# Altium schematic symbol library Analog Devices Data Converters Analog-to-Digital Converters.SchLib: 2404 symbols (part 110 of 213)
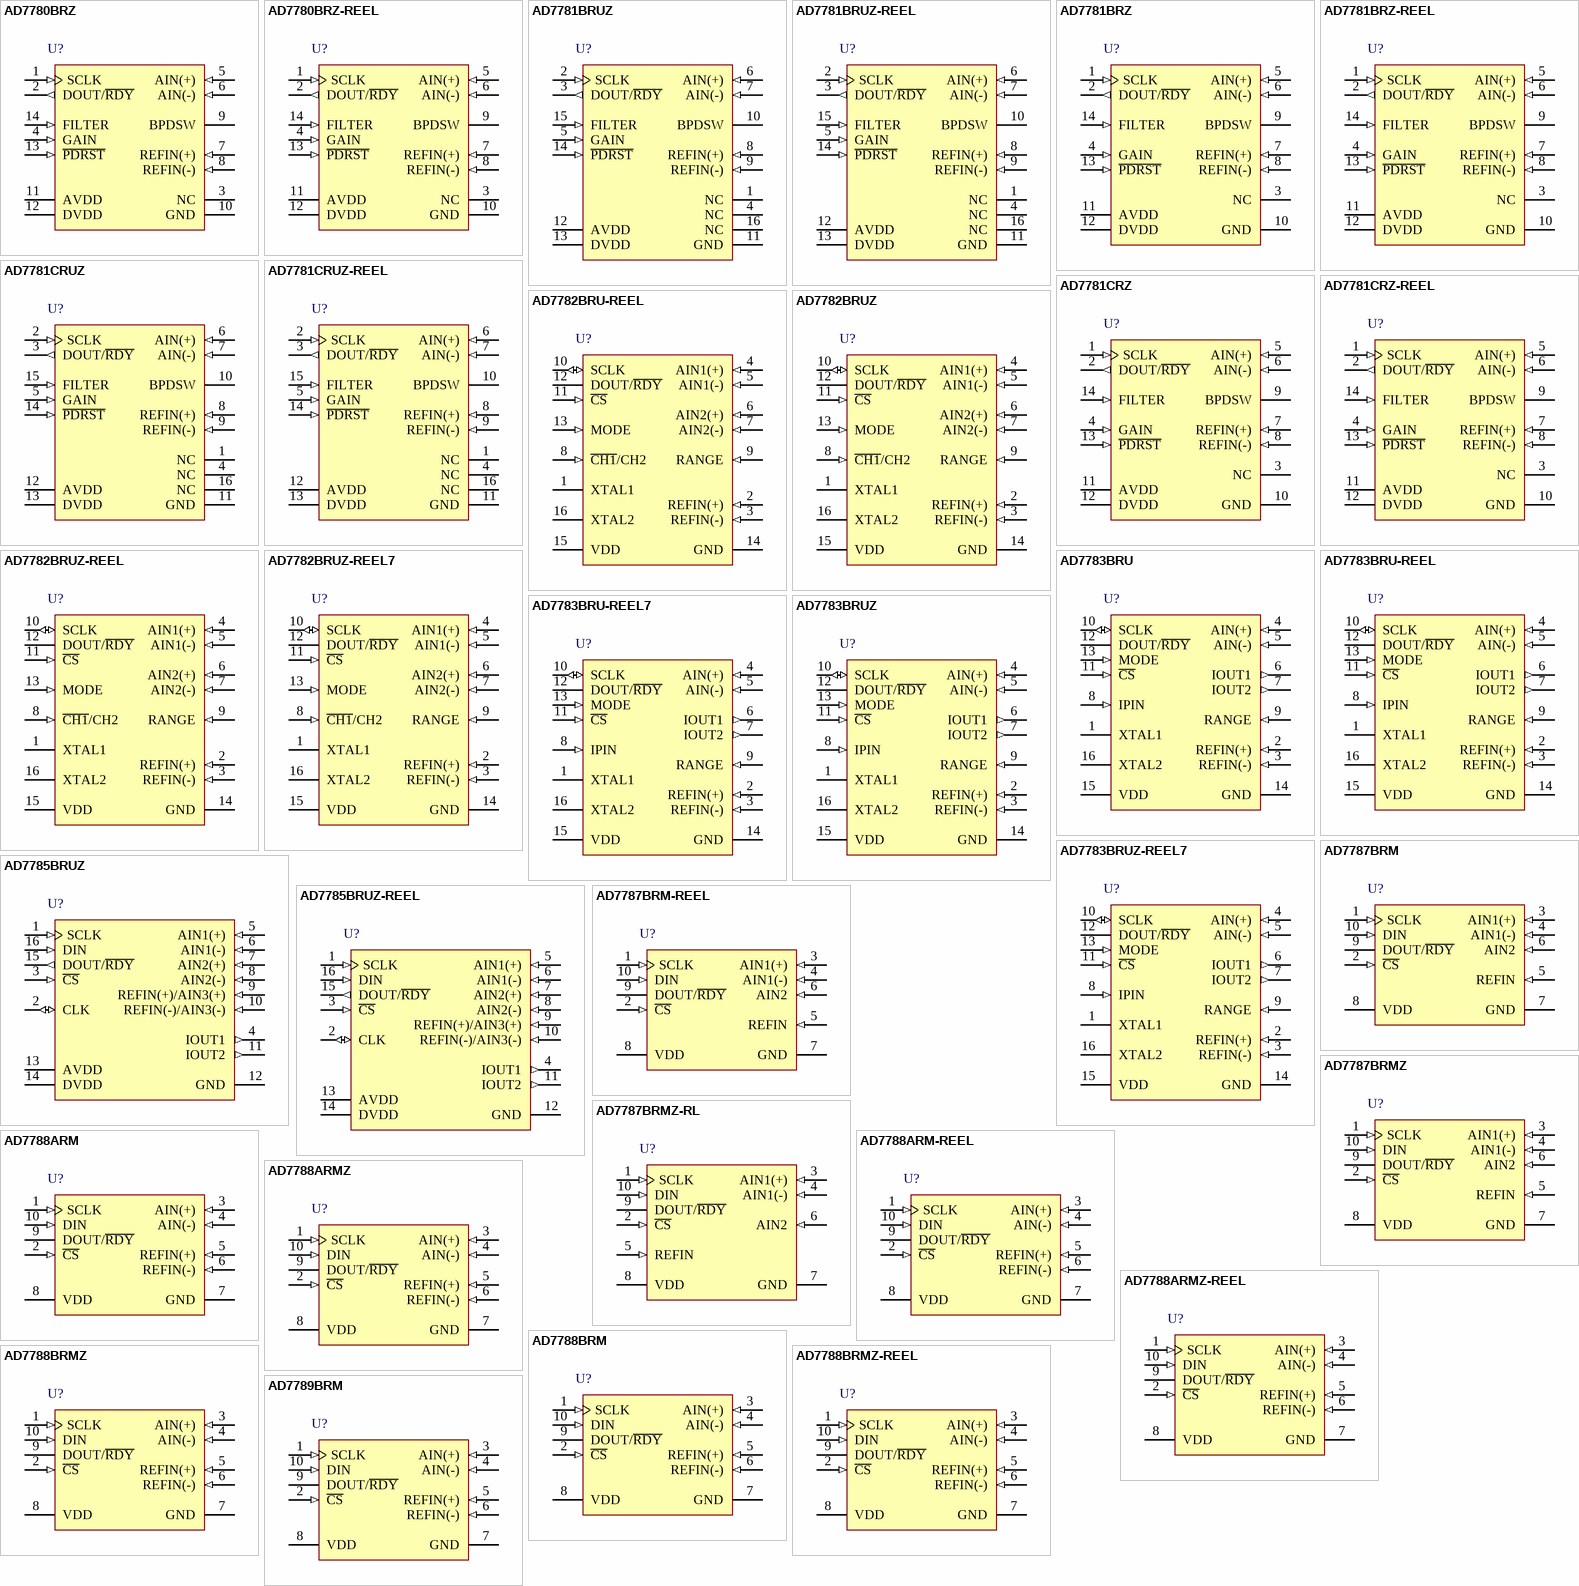
[diagram p265: symbols AD7780BRZ to AD7789BRM]

## AD7782BRU-REEL
designator U?
Dual 24-Bit Sigma-Delta Analog-to-Digital Converter with Serial, SPI Interface, 19.79SPS, -40 to +85 degC, RU-16, Reel; Generic Part Number: AD7782; Manufacturer: Analog Devices; PartNumber: AD7782BRU-REEL; Resolution (Bits): 24; Channels: 2; Throughput Rate (SPS): 19.79; Interface: Ser, SPI; DatasheetVersion: Rev.A; PackageVersion: Nov-2002; PackageReference: RU-16; PackageDescription: 16-Lead Thin Shrink Small Outline Package [TSSOP]; Supplier 1: Digi-Key; Supplier Part Number 1: AD7782BRU-REELTR-ND; Supplier 2: Digi-Key; Supplier Part Number 2: AD7782BRU-REELCT-ND; Supplier 3: Digi-Key; Supplier Part Number 3: AD7782BRU-REELDKR-ND; Supplier 4: Mouser; Supplier Part Number 4: 584-AD7782BRU-R; RoHS: N; Packing: Reel; Mounting Technology: Surface Mount; Code_JEDEC: MO-153-AB; ComponentLink1Description: Manufacturer URL; ComponentLink1URL: http://www.analog.com/en/index.html; ComponentLink2Description: Datasheet; ComponentLink2URL: http://www.analog.com/static/imported-files/data_sheets/AD7782.pdf; ComponentLink3Description: Package Specification; ComponentLink3URL: http://www.analog.com/static/imported-files/packages/36244347913743854010197452789RU16.pdf; ComponentLink4Description: Product URL; ComponentLink4URL: http://www.analog.com/en/analog-to-digital-converters/ad-converters/ad7782/products/product.html
footprint RU-16_N (TSOP, 16-Leads, Body 5x4.4mm, Pitch 0.65mm, IPC Medium Density)
footprint RU-16_L (TSOP, 16-Leads, Body 5x4.4mm, Pitch 0.65mm, IPC High Density)
footprint RU-16_M (TSOP, 16-Leads, Body 5x4.4mm, Pitch 0.65mm, IPC Low Density)
pins: 1 XTAL1 "Input to the 32.768 kHz Crystal Oscillator Inverter.", 2 REFIN(+) (in) "Positive Reference Input. REFIN(+) can lie anywhere between VDD and GND +1 V. The nominal reference voltage (REFIN(+) - REFIN(-)) is 2.5 V, but the part functions with a reference from 1 V to VDD.", 3 REFIN(-) (in) "Negative Reference Input. This reference input can lie anywhere between GND and VDD - 1 V.", 4 AIN1(+) (in) "Analog Input. AIN1(+) is the positive terminal of the fully-differential analog input pair AIN1(+)/AIN1(-).", 5 AIN1(-) (in) "Analog Input. AIN1(-) is the negative terminal of the fully-differential analog input pair AIN1(+)/AIN1(-).", 6 AIN2(+) (in) "Analog Input. AIN2(+) is the positive terminal of the fully-differential analog input pair AIN2(+)/AIN2(-).", 7 AIN2(-) (in) "Analog Input. AIN2(-) is the negative terminal of the fully-differential analog input pair AIN2(+)/AIN2(-).", 8 ~{CH1}/CH2 (in) "Channel Select, Logic Input. With C\H\1\/CH2 = 0, channel AIN1(+)/AIN1(-) is selected while the active channel is AIN2(+)/AIN2(-) when C\H\1\/CH2 = 1.", 9 RANGE (in) "Logic Input which configures the input range on the internal PGA. With RANGE = 0, the full-scale input range is +/-160 mV while the full-scale input range equals +/-2.56 V when RANGE = 1 for a +2.5 V Reference.", 10 SCLK (io) "Serial Clock Input/Output for Data Transfers from the ADC. When the device is operated in master mode SCLK is an output with one SCLK period equal to one XTAL period. In slave mode, SCLK is generated by an external source. (See Datasheet)", 11 ~{CS} (in) "Chip Select Input. C\S\ is an active low logic input used to select the AD7782. When C\S\ is low, the PLL establishes lock and allows the AD7782 to initiate a conversion on the selected channel. When C\S\ is high,the (See Datasheet)", 12 DOUT/~{RDY} (hiz) "Serial Data Output/Data Ready Output. DOUT/R\D\Y\ serves a dual purpose in this interface. When a conversion is initiated, DOUT/R\D\Y\ goes high and remains high until the conversion is complete. DOUT/R\D\Y\ will then return (See Datasheet)", 13 MODE (in) "The MODE pin selects master or slave mode of operation. When MODE = 0, the AD7782 operates in master mode while the AD7782 is configured for slave mode when MODE = 1.", 14 GND (power) "Ground Reference Point for the AD7782.", 15 VDD (power) "Supply Voltage, 3 V or 5 V Nominal.", 16 XTAL2 "Output from the 32.768 kHz Crystal Oscillator Inverter."

## AD7782BRUZ
designator U?
Dual 24-Bit Sigma-Delta Analog-to-Digital Converter with Serial, SPI Interface, 19.79SPS, -40 to +85 degC, RU-16, Pb-Free, Tube; Generic Part Number: AD7782; Manufacturer: Analog Devices; PartNumber: AD7782BRUZ; Resolution (Bits): 24; Channels: 2; Throughput Rate (SPS): 19.79; Interface: Ser, SPI; DatasheetVersion: Rev.A; PackageVersion: Nov-2002; PackageReference: RU-16; PackageDescription: 16-Lead Thin Shrink Small Outline Package [TSSOP]; Supplier 1: Digi-Key; Supplier Part Number 1: AD7782BRUZ-ND; Supplier 2: Mouser; Supplier Part Number 2: 584-AD7782BRUZ; RoHS: Y; Packing: Tube; Mounting Technology: Surface Mount; Code_JEDEC: MO-153-AB; ComponentLink1Description: Manufacturer URL; ComponentLink1URL: http://www.analog.com/en/index.html; ComponentLink2Description: Datasheet; ComponentLink2URL: http://www.analog.com/static/imported-files/data_sheets/AD7782.pdf; ComponentLink3Description: Package Specification; ComponentLink3URL: http://www.analog.com/static/imported-files/packages/36244347913743854010197452789RU16.pdf; ComponentLink4Description: Product URL; ComponentLink4URL: http://www.analog.com/en/analog-to-digital-converters/ad-converters/ad7782/products/product.html
footprint RU-16_N (TSOP, 16-Leads, Body 5x4.4mm, Pitch 0.65mm, IPC Medium Density)
footprint RU-16_L (TSOP, 16-Leads, Body 5x4.4mm, Pitch 0.65mm, IPC High Density)
footprint RU-16_M (TSOP, 16-Leads, Body 5x4.4mm, Pitch 0.65mm, IPC Low Density)
pins: 1 XTAL1 "Input to the 32.768 kHz Crystal Oscillator Inverter.", 2 REFIN(+) (in) "Positive Reference Input. REFIN(+) can lie anywhere between VDD and GND +1 V. The nominal reference voltage (REFIN(+) - REFIN(-)) is 2.5 V, but the part functions with a reference from 1 V to VDD.", 3 REFIN(-) (in) "Negative Reference Input. This reference input can lie anywhere between GND and VDD - 1 V.", 4 AIN1(+) (in) "Analog Input. AIN1(+) is the positive terminal of the fully-differential analog input pair AIN1(+)/AIN1(-).", 5 AIN1(-) (in) "Analog Input. AIN1(-) is the negative terminal of the fully-differential analog input pair AIN1(+)/AIN1(-).", 6 AIN2(+) (in) "Analog Input. AIN2(+) is the positive terminal of the fully-differential analog input pair AIN2(+)/AIN2(-).", 7 AIN2(-) (in) "Analog Input. AIN2(-) is the negative terminal of the fully-differential analog input pair AIN2(+)/AIN2(-).", 8 ~{CH1}/CH2 (in) "Channel Select, Logic Input. With C\H\1\/CH2 = 0, channel AIN1(+)/AIN1(-) is selected while the active channel is AIN2(+)/AIN2(-) when C\H\1\/CH2 = 1.", 9 RANGE (in) "Logic Input which configures the input range on the internal PGA. With RANGE = 0, the full-scale input range is +/-160 mV while the full-scale input range equals +/-2.56 V when RANGE = 1 for a +2.5 V Reference.", 10 SCLK (io) "Serial Clock Input/Output for Data Transfers from the ADC. When the device is operated in master mode SCLK is an output with one SCLK period equal to one XTAL period. In slave mode, SCLK is generated by an external source. (See Datasheet)", 11 ~{CS} (in) "Chip Select Input. C\S\ is an active low logic input used to select the AD7782. When C\S\ is low, the PLL establishes lock and allows the AD7782 to initiate a conversion on the selected channel. When C\S\ is high,the (See Datasheet)", 12 DOUT/~{RDY} (hiz) "Serial Data Output/Data Ready Output. DOUT/R\D\Y\ serves a dual purpose in this interface. When a conversion is initiated, DOUT/R\D\Y\ goes high and remains high until the conversion is complete. DOUT/R\D\Y\ will then return (See Datasheet)", 13 MODE (in) "The MODE pin selects master or slave mode of operation. When MODE = 0, the AD7782 operates in master mode while the AD7782 is configured for slave mode when MODE = 1.", 14 GND (power) "Ground Reference Point for the AD7782.", 15 VDD (power) "Supply Voltage, 3 V or 5 V Nominal.", 16 XTAL2 "Output from the 32.768 kHz Crystal Oscillator Inverter."

## AD7782BRUZ-REEL
designator U?
Dual 24-Bit Sigma-Delta Analog-to-Digital Converter with Serial, SPI Interface, 19.79SPS, -40 to +85 degC, RU-16, Pb-Free, Reel; Generic Part Number: AD7782; Manufacturer: Analog Devices; PartNumber: AD7782BRUZ-REEL; Resolution (Bits): 24; Channels: 2; Throughput Rate (SPS): 19.79; Interface: Ser, SPI; DatasheetVersion: Rev.A; PackageVersion: Nov-2002; PackageReference: RU-16; PackageDescription: 16-Lead Thin Shrink Small Outline Package [TSSOP]; Supplier 1: Digi-Key; Supplier Part Number 1: AD7782BRUZ-REEL-ND; Supplier 2: Mouser; Supplier Part Number 2: 584-AD7782BRUZ-R; RoHS: Y; Packing: Reel; Mounting Technology: Surface Mount; Code_JEDEC: MO-153-AB; ComponentLink1Description: Manufacturer URL; ComponentLink1URL: http://www.analog.com/en/index.html; ComponentLink2Description: Datasheet; ComponentLink2URL: http://www.analog.com/static/imported-files/data_sheets/AD7782.pdf; ComponentLink3Description: Package Specification; ComponentLink3URL: http://www.analog.com/static/imported-files/packages/36244347913743854010197452789RU16.pdf; ComponentLink4Description: Product URL; ComponentLink4URL: http://www.analog.com/en/analog-to-digital-converters/ad-converters/ad7782/products/product.html
footprint RU-16_N (TSOP, 16-Leads, Body 5x4.4mm, Pitch 0.65mm, IPC Medium Density)
footprint RU-16_L (TSOP, 16-Leads, Body 5x4.4mm, Pitch 0.65mm, IPC High Density)
footprint RU-16_M (TSOP, 16-Leads, Body 5x4.4mm, Pitch 0.65mm, IPC Low Density)
pins: 1 XTAL1 "Input to the 32.768 kHz Crystal Oscillator Inverter.", 2 REFIN(+) (in) "Positive Reference Input. REFIN(+) can lie anywhere between VDD and GND +1 V. The nominal reference voltage (REFIN(+) - REFIN(-)) is 2.5 V, but the part functions with a reference from 1 V to VDD.", 3 REFIN(-) (in) "Negative Reference Input. This reference input can lie anywhere between GND and VDD - 1 V.", 4 AIN1(+) (in) "Analog Input. AIN1(+) is the positive terminal of the fully-differential analog input pair AIN1(+)/AIN1(-).", 5 AIN1(-) (in) "Analog Input. AIN1(-) is the negative terminal of the fully-differential analog input pair AIN1(+)/AIN1(-).", 6 AIN2(+) (in) "Analog Input. AIN2(+) is the positive terminal of the fully-differential analog input pair AIN2(+)/AIN2(-).", 7 AIN2(-) (in) "Analog Input. AIN2(-) is the negative terminal of the fully-differential analog input pair AIN2(+)/AIN2(-).", 8 ~{CH1}/CH2 (in) "Channel Select, Logic Input. With C\H\1\/CH2 = 0, channel AIN1(+)/AIN1(-) is selected while the active channel is AIN2(+)/AIN2(-) when C\H\1\/CH2 = 1.", 9 RANGE (in) "Logic Input which configures the input range on the internal PGA. With RANGE = 0, the full-scale input range is +/-160 mV while the full-scale input range equals +/-2.56 V when RANGE = 1 for a +2.5 V Reference.", 10 SCLK (io) "Serial Clock Input/Output for Data Transfers from the ADC. When the device is operated in master mode SCLK is an output with one SCLK period equal to one XTAL period. In slave mode, SCLK is generated by an external source. (See Datasheet)", 11 ~{CS} (in) "Chip Select Input. C\S\ is an active low logic input used to select the AD7782. When C\S\ is low, the PLL establishes lock and allows the AD7782 to initiate a conversion on the selected channel. When C\S\ is high,the (See Datasheet)", 12 DOUT/~{RDY} (hiz) "Serial Data Output/Data Ready Output. DOUT/R\D\Y\ serves a dual purpose in this interface. When a conversion is initiated, DOUT/R\D\Y\ goes high and remains high until the conversion is complete. DOUT/R\D\Y\ will then return (See Datasheet)", 13 MODE (in) "The MODE pin selects master or slave mode of operation. When MODE = 0, the AD7782 operates in master mode while the AD7782 is configured for slave mode when MODE = 1.", 14 GND (power) "Ground Reference Point for the AD7782.", 15 VDD (power) "Supply Voltage, 3 V or 5 V Nominal.", 16 XTAL2 "Output from the 32.768 kHz Crystal Oscillator Inverter."

## AD7782BRUZ-REEL7
designator U?
Dual 24-Bit Sigma-Delta Analog-to-Digital Converter with Serial, SPI Interface, 19.79SPS, -40 to +85 degC, RU-16, Pb-Free, Reel; Generic Part Number: AD7782; Manufacturer: Analog Devices; PartNumber: AD7782BRUZ-REEL7; Resolution (Bits): 24; Channels: 2; Throughput Rate (SPS): 19.79; Interface: Ser, SPI; DatasheetVersion: Rev.A; PackageVersion: Nov-2002; PackageReference: RU-16; PackageDescription: 16-Lead Thin Shrink Small Outline Package [TSSOP]; Supplier 1: Digi-Key; Supplier Part Number 1: AD7782BRUZ-REEL7-ND; Supplier 2: Mouser; Supplier Part Number 2: 584-AD7782BRUZ-R7; RoHS: Y; Packing: Reel; Mounting Technology: Surface Mount; Code_JEDEC: MO-153-AB; ComponentLink1Description: Manufacturer URL; ComponentLink1URL: http://www.analog.com/en/index.html; ComponentLink2Description: Datasheet; ComponentLink2URL: http://www.analog.com/static/imported-files/data_sheets/AD7782.pdf; ComponentLink3Description: Package Specification; ComponentLink3URL: http://www.analog.com/static/imported-files/packages/36244347913743854010197452789RU16.pdf; ComponentLink4Description: Product URL; ComponentLink4URL: http://www.analog.com/en/analog-to-digital-converters/ad-converters/ad7782/products/product.html
footprint RU-16_N (TSOP, 16-Leads, Body 5x4.4mm, Pitch 0.65mm, IPC Medium Density)
footprint RU-16_L (TSOP, 16-Leads, Body 5x4.4mm, Pitch 0.65mm, IPC High Density)
footprint RU-16_M (TSOP, 16-Leads, Body 5x4.4mm, Pitch 0.65mm, IPC Low Density)
pins: 1 XTAL1 "Input to the 32.768 kHz Crystal Oscillator Inverter.", 2 REFIN(+) (in) "Positive Reference Input. REFIN(+) can lie anywhere between VDD and GND +1 V. The nominal reference voltage (REFIN(+) - REFIN(-)) is 2.5 V, but the part functions with a reference from 1 V to VDD.", 3 REFIN(-) (in) "Negative Reference Input. This reference input can lie anywhere between GND and VDD - 1 V.", 4 AIN1(+) (in) "Analog Input. AIN1(+) is the positive terminal of the fully-differential analog input pair AIN1(+)/AIN1(-).", 5 AIN1(-) (in) "Analog Input. AIN1(-) is the negative terminal of the fully-differential analog input pair AIN1(+)/AIN1(-).", 6 AIN2(+) (in) "Analog Input. AIN2(+) is the positive terminal of the fully-differential analog input pair AIN2(+)/AIN2(-).", 7 AIN2(-) (in) "Analog Input. AIN2(-) is the negative terminal of the fully-differential analog input pair AIN2(+)/AIN2(-).", 8 ~{CH1}/CH2 (in) "Channel Select, Logic Input. With C\H\1\/CH2 = 0, channel AIN1(+)/AIN1(-) is selected while the active channel is AIN2(+)/AIN2(-) when C\H\1\/CH2 = 1.", 9 RANGE (in) "Logic Input which configures the input range on the internal PGA. With RANGE = 0, the full-scale input range is +/-160 mV while the full-scale input range equals +/-2.56 V when RANGE = 1 for a +2.5 V Reference.", 10 SCLK (io) "Serial Clock Input/Output for Data Transfers from the ADC. When the device is operated in master mode SCLK is an output with one SCLK period equal to one XTAL period. In slave mode, SCLK is generated by an external source. (See Datasheet)", 11 ~{CS} (in) "Chip Select Input. C\S\ is an active low logic input used to select the AD7782. When C\S\ is low, the PLL establishes lock and allows the AD7782 to initiate a conversion on the selected channel. When C\S\ is high,the (See Datasheet)", 12 DOUT/~{RDY} (hiz) "Serial Data Output/Data Ready Output. DOUT/R\D\Y\ serves a dual purpose in this interface. When a conversion is initiated, DOUT/R\D\Y\ goes high and remains high until the conversion is complete. DOUT/R\D\Y\ will then return (See Datasheet)", 13 MODE (in) "The MODE pin selects master or slave mode of operation. When MODE = 0, the AD7782 operates in master mode while the AD7782 is configured for slave mode when MODE = 1.", 14 GND (power) "Ground Reference Point for the AD7782.", 15 VDD (power) "Supply Voltage, 3 V or 5 V Nominal.", 16 XTAL2 "Output from the 32.768 kHz Crystal Oscillator Inverter."

## AD7783BRU
designator U?
Single 24-Bit Sigma-Delta Analog-to-Digital Converter with Serial, SPI Interface, 19.79SPS, -40 to +85 degC, RU-16, Tube; Generic Part Number: AD7783; Manufacturer: Analog Devices; PartNumber: AD7783BRU; Resolution (Bits): 24; Channels: 1; Throughput Rate (SPS): 19.79; Interface: Ser, SPI; DatasheetVersion: Rev.C; PackageVersion: Nov-2002; PackageReference: RU-16; PackageDescription: 16-Lead Thin Shrink Small Outline Package [TSSOP]; Supplier 1: Digi-Key; Supplier Part Number 1: AD7783BRU-ND; Supplier 2: Mouser; Supplier Part Number 2: 584-AD7783BRU; RoHS: N; Packing: Tube; Mounting Technology: Surface Mount; Code_JEDEC: MO-153-AB; ComponentLink1Description: Manufacturer URL; ComponentLink1URL: http://www.analog.com/en/index.html; ComponentLink2Description: Datasheet; ComponentLink2URL: http://www.analog.com/static/imported-files/data_sheets/AD7783.pdf; ComponentLink3Description: Package Specification; ComponentLink3URL: http://www.analog.com/static/imported-files/packages/36244347913743854010197452789RU16.pdf; ComponentLink4Description: Product URL; ComponentLink4URL: http://www.analog.com/en/analog-to-digital-converters/ad-converters/ad7783/products/product.html
footprint RU-16_N (TSOP, 16-Leads, Body 5x4.4mm, Pitch 0.65mm, IPC Medium Density)
footprint RU-16_L (TSOP, 16-Leads, Body 5x4.4mm, Pitch 0.65mm, IPC High Density)
footprint RU-16_M (TSOP, 16-Leads, Body 5x4.4mm, Pitch 0.65mm, IPC Low Density)
pins: 1 XTAL1 "Input to the 32.768 kHz Crystal Oscillator Inverter.", 2 REFIN(+) (in) "Positive Reference Input. REFIN(+) can lie anywhere between VDD and GND + 1 V. The nominal reference voltage (REFIN(+) - REFIN(-)) is 2.5 V, but the part functions with a reference from 1 V to VDD.", 3 REFIN(-) (in) "Negative Reference Input. This reference input can lie anywhere between GND and VDD - 1 V.", 4 AIN(+) (in) "Analog Input. AIN(+) is the positive terminal of the fully differential analog input pair AIN(+)/AIN(-).", 5 AIN(-) (in) "Analog Input. AIN(-) is the negative terminal of the fully differential analog input pair AIN(+)/AIN(-).", 6 IOUT1 (out) "Output from Internal 200 mA Excitation Current Source. Either current source IEXC1 or IEXC2 can be switched to this output using hardware control pin IPIN.", 7 IOUT2 (out) "Output from Internal 200 mA Excitation Current Source. Either current source IEXC1 or IEXC2 can be switched to this output using hardware control pin IPIN.", 8 IPIN (in) "Logic Input that Selects the Routing of the On-Chip Current Sources. When IPIN is tied to GND, IEXC1 is routed to IOUT1 and IEXC2 is routed to IOUT2. When IPIN is tied to VDD, IEXC1 is routed to IOUT2 and IEXC2 is routed to (See Datasheet)", 9 RANGE (in) "Logic Input that Configures the Input Range on the Internal PGA. With RANGE = 0, the full-scale input range is +/-160 mV; the full-scale input range equals +/-2.56 V when RANGE = 1 for a 2.5 V reference.", 10 SCLK (io) "Serial Clock Input/Output for Data Transfers from the ADC. When the device is operated in master mode,SCLK is an output with one SCLK period equal to one XTAL period. In slave mode, SCLK is generated by an external source. (See Datasheet)", 11 ~{CS} (in) "Chip Select Input. C\S\ is an active low logic input used to select the AD7783. When C\S\ is low, the PLL establishes lock and allows the AD7783 to initiate a conversion. When C\S\ is high, the conversion is aborted,DOUT and (See Datasheet)", 12 DOUT/~{RDY} (hiz) "Serial Data Output/Data Ready Output. DOUT/RDY serves a dual purpose in this interface. When a conversion is initiated, DOUT/RDY goes high and remains high until the conversion is complete. DOUT/RDY will then return low to (See Datasheet)", 13 MODE (in) "The MODE pin selects master or slave mode of operation. When MODE = 0, the AD7783 operates in master mode; the AD7783 is configured for slave mode when MODE = 1.", 14 GND (power) "Ground Reference Point for the AD7783.", 15 VDD (power) "Supply Voltage, 3 V or 5 V Nominal.", 16 XTAL2 "Output from the 32.768 kHz Crystal Oscillator Inverter."

## AD7783BRU-REEL
designator U?
Single 24-Bit Sigma-Delta Analog-to-Digital Converter with Serial, SPI Interface, 19.79SPS, -40 to +85 degC, RU-16, Reel; Generic Part Number: AD7783; Manufacturer: Analog Devices; PartNumber: AD7783BRU-REEL; Resolution (Bits): 24; Channels: 1; Throughput Rate (SPS): 19.79; Interface: Ser, SPI; DatasheetVersion: Rev.C; PackageVersion: Nov-2002; PackageReference: RU-16; PackageDescription: 16-Lead Thin Shrink Small Outline Package [TSSOP]; Supplier 1: Digi-Key; Supplier Part Number 1: AD7783BRU-REEL-ND; Supplier 2: Mouser; Supplier Part Number 2: 584-AD7783BRU-R; RoHS: N; Packing: Reel; Mounting Technology: Surface Mount; Code_JEDEC: MO-153-AB; ComponentLink1Description: Manufacturer URL; ComponentLink1URL: http://www.analog.com/en/index.html; ComponentLink2Description: Datasheet; ComponentLink2URL: http://www.analog.com/static/imported-files/data_sheets/AD7783.pdf; ComponentLink3Description: Package Specification; ComponentLink3URL: http://www.analog.com/static/imported-files/packages/36244347913743854010197452789RU16.pdf; ComponentLink4Description: Product URL; ComponentLink4URL: http://www.analog.com/en/analog-to-digital-converters/ad-converters/ad7783/products/product.html
footprint RU-16_N (TSOP, 16-Leads, Body 5x4.4mm, Pitch 0.65mm, IPC Medium Density)
footprint RU-16_L (TSOP, 16-Leads, Body 5x4.4mm, Pitch 0.65mm, IPC High Density)
footprint RU-16_M (TSOP, 16-Leads, Body 5x4.4mm, Pitch 0.65mm, IPC Low Density)
pins: 1 XTAL1 "Input to the 32.768 kHz Crystal Oscillator Inverter.", 2 REFIN(+) (in) "Positive Reference Input. REFIN(+) can lie anywhere between VDD and GND + 1 V. The nominal reference voltage (REFIN(+) - REFIN(-)) is 2.5 V, but the part functions with a reference from 1 V to VDD.", 3 REFIN(-) (in) "Negative Reference Input. This reference input can lie anywhere between GND and VDD - 1 V.", 4 AIN(+) (in) "Analog Input. AIN(+) is the positive terminal of the fully differential analog input pair AIN(+)/AIN(-).", 5 AIN(-) (in) "Analog Input. AIN(-) is the negative terminal of the fully differential analog input pair AIN(+)/AIN(-).", 6 IOUT1 (out) "Output from Internal 200 mA Excitation Current Source. Either current source IEXC1 or IEXC2 can be switched to this output using hardware control pin IPIN.", 7 IOUT2 (out) "Output from Internal 200 mA Excitation Current Source. Either current source IEXC1 or IEXC2 can be switched to this output using hardware control pin IPIN.", 8 IPIN (in) "Logic Input that Selects the Routing of the On-Chip Current Sources. When IPIN is tied to GND, IEXC1 is routed to IOUT1 and IEXC2 is routed to IOUT2. When IPIN is tied to VDD, IEXC1 is routed to IOUT2 and IEXC2 is routed to (See Datasheet)", 9 RANGE (in) "Logic Input that Configures the Input Range on the Internal PGA. With RANGE = 0, the full-scale input range is +/-160 mV; the full-scale input range equals +/-2.56 V when RANGE = 1 for a 2.5 V reference.", 10 SCLK (io) "Serial Clock Input/Output for Data Transfers from the ADC. When the device is operated in master mode,SCLK is an output with one SCLK period equal to one XTAL period. In slave mode, SCLK is generated by an external source. (See Datasheet)", 11 ~{CS} (in) "Chip Select Input. C\S\ is an active low logic input used to select the AD7783. When C\S\ is low, the PLL establishes lock and allows the AD7783 to initiate a conversion. When C\S\ is high, the conversion is aborted,DOUT and (See Datasheet)", 12 DOUT/~{RDY} (hiz) "Serial Data Output/Data Ready Output. DOUT/RDY serves a dual purpose in this interface. When a conversion is initiated, DOUT/RDY goes high and remains high until the conversion is complete. DOUT/RDY will then return low to (See Datasheet)", 13 MODE (in) "The MODE pin selects master or slave mode of operation. When MODE = 0, the AD7783 operates in master mode; the AD7783 is configured for slave mode when MODE = 1.", 14 GND (power) "Ground Reference Point for the AD7783.", 15 VDD (power) "Supply Voltage, 3 V or 5 V Nominal.", 16 XTAL2 "Output from the 32.768 kHz Crystal Oscillator Inverter."

## AD7783BRU-REEL7
designator U?
Single 24-Bit Sigma-Delta Analog-to-Digital Converter with Serial, SPI Interface, 19.79SPS, -40 to +85 degC, RU-16, Reel; Generic Part Number: AD7783; Manufacturer: Analog Devices; PartNumber: AD7783BRU-REEL7; Resolution (Bits): 24; Channels: 1; Throughput Rate (SPS): 19.79; Interface: Ser, SPI; DatasheetVersion: Rev.C; PackageVersion: Nov-2002; PackageReference: RU-16; PackageDescription: 16-Lead Thin Shrink Small Outline Package [TSSOP]; Supplier 1: Digi-Key; Supplier Part Number 1: AD7783BRU-REEL7-ND; Supplier 2: Mouser; Supplier Part Number 2: 584-AD7783BRU-R7; RoHS: N; Packing: Reel; Mounting Technology: Surface Mount; Code_JEDEC: MO-153-AB; ComponentLink1Description: Manufacturer URL; ComponentLink1URL: http://www.analog.com/en/index.html; ComponentLink2Description: Datasheet; ComponentLink2URL: http://www.analog.com/static/imported-files/data_sheets/AD7783.pdf; ComponentLink3Description: Package Specification; ComponentLink3URL: http://www.analog.com/static/imported-files/packages/36244347913743854010197452789RU16.pdf; ComponentLink4Description: Product URL; ComponentLink4URL: http://www.analog.com/en/analog-to-digital-converters/ad-converters/ad7783/products/product.html
footprint RU-16_N (TSOP, 16-Leads, Body 5x4.4mm, Pitch 0.65mm, IPC Medium Density)
footprint RU-16_L (TSOP, 16-Leads, Body 5x4.4mm, Pitch 0.65mm, IPC High Density)
footprint RU-16_M (TSOP, 16-Leads, Body 5x4.4mm, Pitch 0.65mm, IPC Low Density)
pins: 1 XTAL1 "Input to the 32.768 kHz Crystal Oscillator Inverter.", 2 REFIN(+) (in) "Positive Reference Input. REFIN(+) can lie anywhere between VDD and GND + 1 V. The nominal reference voltage (REFIN(+) - REFIN(-)) is 2.5 V, but the part functions with a reference from 1 V to VDD.", 3 REFIN(-) (in) "Negative Reference Input. This reference input can lie anywhere between GND and VDD - 1 V.", 4 AIN(+) (in) "Analog Input. AIN(+) is the positive terminal of the fully differential analog input pair AIN(+)/AIN(-).", 5 AIN(-) (in) "Analog Input. AIN(-) is the negative terminal of the fully differential analog input pair AIN(+)/AIN(-).", 6 IOUT1 (out) "Output from Internal 200 mA Excitation Current Source. Either current source IEXC1 or IEXC2 can be switched to this output using hardware control pin IPIN.", 7 IOUT2 (out) "Output from Internal 200 mA Excitation Current Source. Either current source IEXC1 or IEXC2 can be switched to this output using hardware control pin IPIN.", 8 IPIN (in) "Logic Input that Selects the Routing of the On-Chip Current Sources. When IPIN is tied to GND, IEXC1 is routed to IOUT1 and IEXC2 is routed to IOUT2. When IPIN is tied to VDD, IEXC1 is routed to IOUT2 and IEXC2 is routed to (See Datasheet)", 9 RANGE (in) "Logic Input that Configures the Input Range on the Internal PGA. With RANGE = 0, the full-scale input range is +/-160 mV; the full-scale input range equals +/-2.56 V when RANGE = 1 for a 2.5 V reference.", 10 SCLK (io) "Serial Clock Input/Output for Data Transfers from the ADC. When the device is operated in master mode,SCLK is an output with one SCLK period equal to one XTAL period. In slave mode, SCLK is generated by an external source. (See Datasheet)", 11 ~{CS} (in) "Chip Select Input. C\S\ is an active low logic input used to select the AD7783. When C\S\ is low, the PLL establishes lock and allows the AD7783 to initiate a conversion. When C\S\ is high, the conversion is aborted,DOUT and (See Datasheet)", 12 DOUT/~{RDY} (hiz) "Serial Data Output/Data Ready Output. DOUT/RDY serves a dual purpose in this interface. When a conversion is initiated, DOUT/RDY goes high and remains high until the conversion is complete. DOUT/RDY will then return low to (See Datasheet)", 13 MODE (in) "The MODE pin selects master or slave mode of operation. When MODE = 0, the AD7783 operates in master mode; the AD7783 is configured for slave mode when MODE = 1.", 14 GND (power) "Ground Reference Point for the AD7783.", 15 VDD (power) "Supply Voltage, 3 V or 5 V Nominal.", 16 XTAL2 "Output from the 32.768 kHz Crystal Oscillator Inverter."
